# Altium footprint library SparkFun-Retired.PCBLIB: 302 footprints (part 19 of 19)
Each footprint in its own frame and in the unit in brackets; x right, y up, seen from the top. Pads: shape width x height; smd on the part's side, far side on the other; paste and mask are expansions set on the pad; w line width, h text height; cw(c..) or ccw(c..) is an arc to the next point about the centre after c.
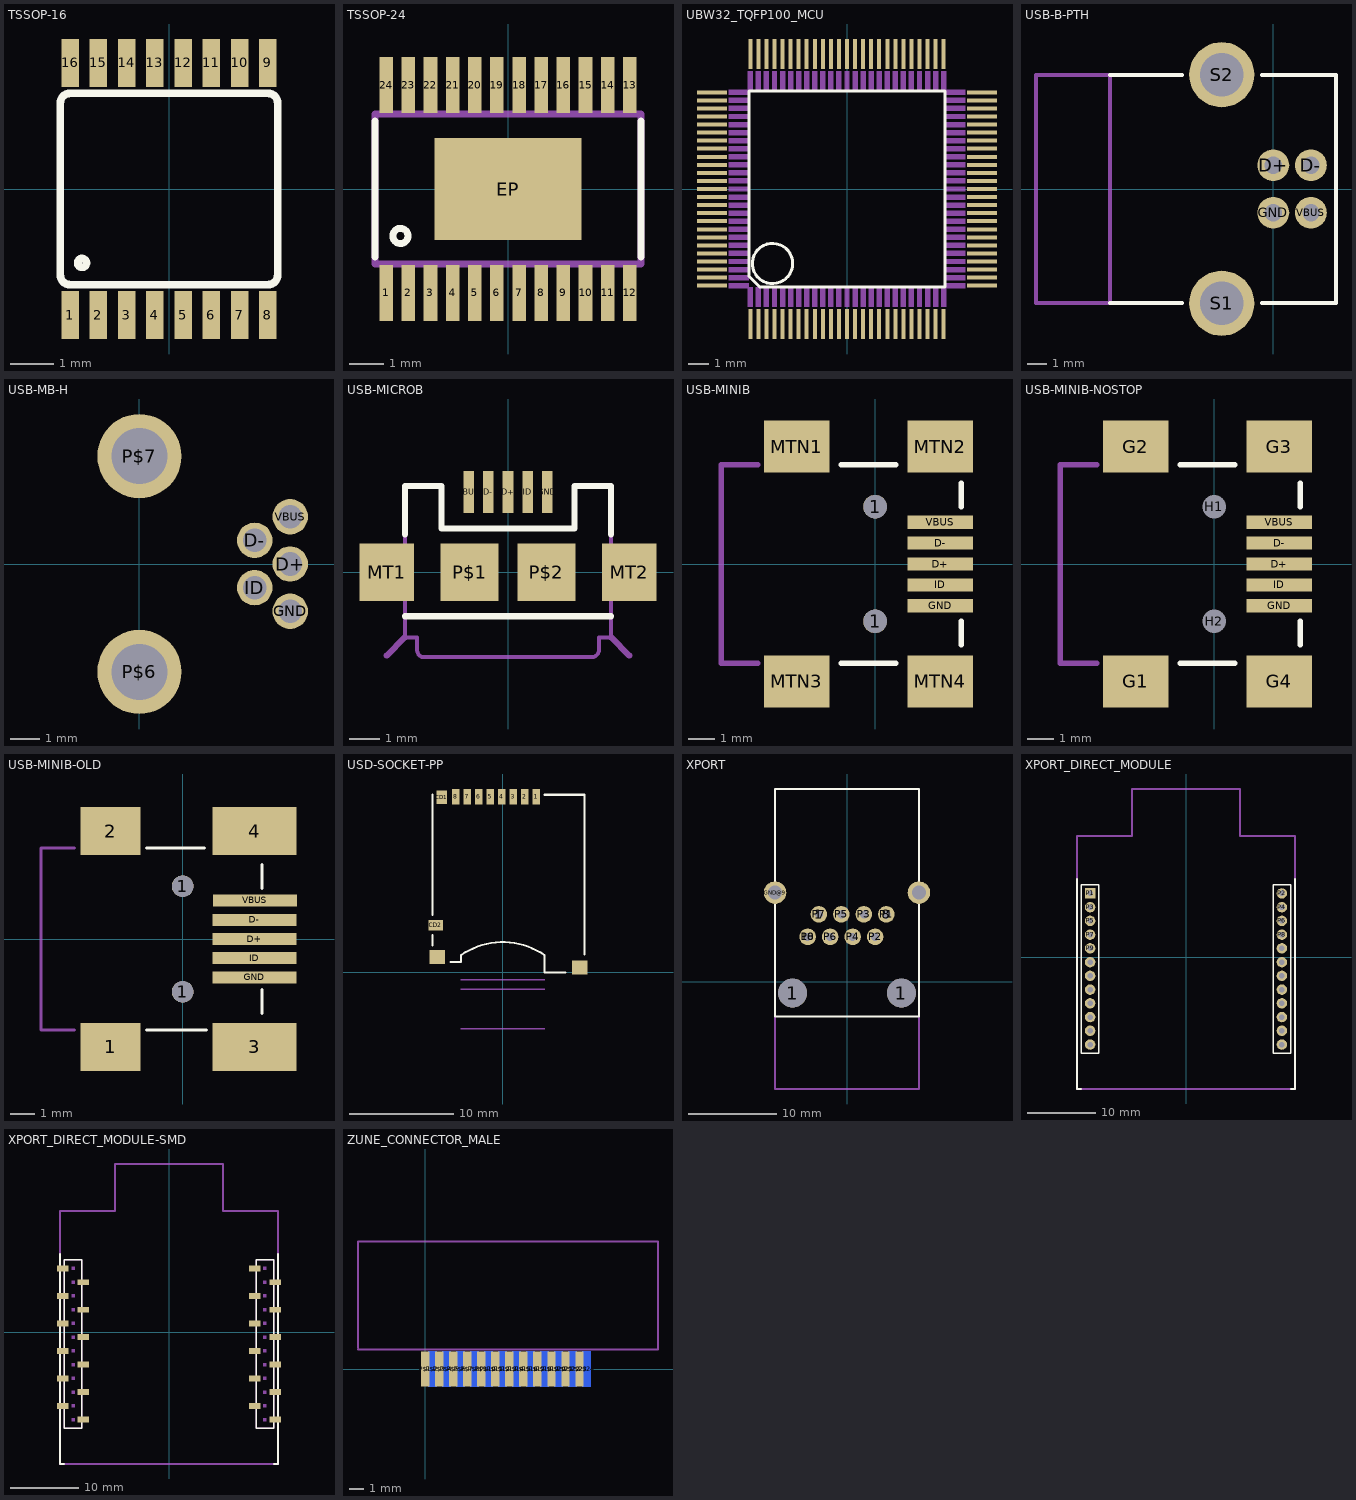
[diagram p18: the footprints below, top view; thin cyan lines are the x and y axes]

## TSSOP-16 [mil]
pads (16):
  rect 15.75x43.31 smd: 1(-89.57,-114.17) 2(-63.98,-114.17) 3(-38.39,-114.17) 4(-12.8,-114.17) 5(12.8,-114.17) 6(38.39,-114.17) 7(63.98,-114.17) 8(89.57,-114.17) 9(89.57,114.17) 10(63.98,114.17) 11(38.39,114.17) 12(12.8,114.17) 13(-12.8,114.17) 14(-38.39,114.17) 15(-63.98,114.17) 16(-89.57,114.17)
Top Overlay:
  circle w7: c-78.74,-66.93 r3.94
  lines w7: -98.43,-77.81 ccw(c-89.62,-77.81) -89.62,-86.61 89.62,-86.61 ccw(c89.62,-77.81) 98.43,-77.81 98.43,77.81 ccw(c89.62,77.81) 89.62,86.61 -89.62,86.61 ccw(c-89.62,77.81) -98.43,77.81 -98.43,-77.81
Mechanical 16:
  rectangle: 6.89,-125.98 18.7,-102.36
  rectangle: -18.7,-125.98 -6.89,-102.36
  rectangle: -44.29,-125.98 -32.48,-102.36
  rectangle: -69.88,-125.98 -58.07,-102.36
  rectangle: 32.48,-125.98 44.29,-102.36
  rectangle: 58.07,-125.98 69.88,-102.36
  rectangle: 83.66,-125.98 95.47,-102.36
  rectangle: -95.47,-125.98 -83.66,-102.36
  region: -6.89,125.98 -18.7,125.98 -18.7,102.36 -6.89,102.36
  region: 18.7,125.98 6.89,125.98 6.89,102.36 18.7,102.36
  region: 44.29,125.98 32.48,125.98 32.48,102.36 44.29,102.36
  region: 69.88,125.98 58.07,125.98 58.07,102.36 69.88,102.36
  region: -32.48,125.98 -44.29,125.98 -44.29,102.36 -32.48,102.36
  region: -58.07,125.98 -69.88,125.98 -69.88,102.36 -58.07,102.36
  region: -83.66,125.98 -95.47,125.98 -95.47,102.36 -83.66,102.36
  region: 95.47,125.98 83.66,125.98 83.66,102.36 95.47,102.36

## TSSOP-24 [mm]
pads (25):
  rect 0.4x1.65 smd: 1(-3.575,-3.05) 2(-2.925,-3.05) 3(-2.275,-3.05) 4(-1.625,-3.05) 5(-0.975,-3.05) 6(-0.325,-3.05) 7(0.325,-3.05) 8(0.975,-3.05) 9(1.625,-3.05) 10(2.275,-3.05) 11(2.925,-3.05) 12(3.575,-3.05) 13(3.575,3.05) 14(2.925,3.05) 15(2.275,3.05) 16(1.625,3.05) 17(0.975,3.05) 18(0.325,3.05) 19(-0.325,3.05) 20(-0.975,3.05) 21(-1.625,3.05) 22(-2.275,3.05) 23(-2.925,3.05) 24(-3.575,3.05)
  rect 4.32x3 smd: EP(0,0)
Top Overlay:
  circle w0.203: c-3.156,-1.378 r0.223
  lines w0.203: -3.9,-2 -3.9,2 ; 3.9,-2 3.9,2
Mechanical 16:
  rectangle: 0.2,-3.2 0.45,-2.2
  rectangle: 0.85,-3.2 1.1,-2.2
  rectangle: 1.5,-3.2 1.75,-2.2
  rectangle: 2.15,-3.2 2.4,-2.2
  rectangle: 2.8,-3.2 3.05,-2.2
  rectangle: 3.45,-3.2 3.7,-2.2
  rectangle: -0.45,-3.2 -0.2,-2.2
  rectangle: -1.1,-3.2 -0.85,-2.2
  rectangle: -1.75,-3.2 -1.5,-2.2
  rectangle: -2.4,-3.2 -2.15,-2.2
  rectangle: -3.05,-3.2 -2.8,-2.2
  rectangle: -3.7,-3.2 -3.45,-2.2
  rectangle: 0.2,2.2 0.45,3.2
  rectangle: 0.85,2.2 1.1,3.2
  rectangle: 1.5,2.2 1.75,3.2
  rectangle: 2.15,2.2 2.4,3.2
  rectangle: 2.8,2.2 3.05,3.2
  rectangle: 3.45,2.2 3.7,3.2
  rectangle: -0.45,2.2 -0.2,3.2
  rectangle: -1.1,2.2 -0.85,3.2
  rectangle: -1.75,2.2 -1.5,3.2
  rectangle: -2.4,2.2 -2.15,3.2
  rectangle: -3.05,2.2 -2.8,3.2
  rectangle: -3.7,2.2 -3.45,3.2
  lines w0.203: -3.9,-2.2 3.9,-2.2 3.9,2.2 -3.9,2.2 -3.9,-2.2

## UBW32_TQFP100_MCU [mm]
pads (100):
  rect 0.2x1.5 smd: 1(-4.8,-6.7) 2(-4.4,-6.7) 3(-4,-6.7) 4(-3.6,-6.7) 5(-3.2,-6.7) 6(-2.8,-6.7) 7(-2.4,-6.7) 8(-2,-6.7) 9(-1.6,-6.7) 10(-1.2,-6.7) 11(-0.8,-6.7) 12(-0.4,-6.7) 13(0,-6.7) 14(0.4,-6.7) 15(0.8,-6.7) 16(1.2,-6.7) 17(1.6,-6.7) 18(2,-6.7) 19(2.4,-6.7) 20(2.8,-6.7) 21(3.2,-6.7) 22(3.6,-6.7) 23(4,-6.7) 24(4.4,-6.7) 25(4.8,-6.7) 51(4.8,6.7) 52(4.4,6.7) 53(4,6.7) 54(3.6,6.7) 55(3.2,6.7) 56(2.8,6.7) 57(2.4,6.7) 58(2,6.7) 59(1.6,6.7) 60(1.2,6.7) 61(0.8,6.7) 62(0.4,6.7) 63(0,6.7) 64(-0.4,6.7) 65(-0.8,6.7) 66(-1.2,6.7) 67(-1.6,6.7) 68(-2,6.7) 69(-2.4,6.7) 70(-2.8,6.7) 71(-3.2,6.7) 72(-3.6,6.7) 73(-4,6.7) 74(-4.4,6.7) 75(-4.8,6.7)
  rect 1.5x0.2 smd: 26(6.7,-4.8) 27(6.7,-4.4) 28(6.7,-4) 29(6.7,-3.6) 30(6.7,-3.2) 31(6.7,-2.8) 32(6.7,-2.4) 33(6.7,-2) 34(6.7,-1.6) 35(6.7,-1.2) 36(6.7,-0.8) 37(6.7,-0.4) 38(6.7,0) 39(6.7,0.4) 40(6.7,0.8) 41(6.7,1.2) 42(6.7,1.6) 43(6.7,2) 44(6.7,2.4) 45(6.7,2.8) 46(6.7,3.2) 47(6.7,3.6) 48(6.7,4) 49(6.7,4.4) 50(6.7,4.8) 76(-6.7,4.8) 77(-6.7,4.4) 78(-6.7,4) 79(-6.7,3.6) 80(-6.7,3.2) 81(-6.7,2.8) 82(-6.7,2.4) 83(-6.7,2) 84(-6.7,1.6) 85(-6.7,1.2) 86(-6.7,0.8) 87(-6.7,0.4) 88(-6.7,0) 89(-6.7,-0.4) 90(-6.7,-0.8) 91(-6.7,-1.2) 92(-6.7,-1.6) 93(-6.7,-2) 94(-6.7,-2.4) 95(-6.7,-2.8) 96(-6.7,-3.2) 97(-6.7,-3.6) 98(-6.7,-4) 99(-6.7,-4.4) 100(-6.7,-4.8)
Top Overlay:
  circle w0.152: c-3.7,-3.7 r1
  lines w0.152: -4.873,-4.323 -4.323,-4.873 4.873,-4.873 4.873,4.873 -4.873,4.873 -4.873,-4.323
Top Paste:
  rectangle: -7.209,4.707 -6.386,4.892
  rectangle: -6.952,4.313 -6.154,4.491
  rectangle: -7.186,3.907 -6.363,4.092
  rectangle: -6.929,3.513 -6.132,3.691
  rectangle: -7.198,3.109 -6.375,3.294
  rectangle: -6.942,2.715 -6.144,2.893
  rectangle: -7.209,2.309 -6.386,2.494
  rectangle: -6.952,1.915 -6.154,2.093
  rectangle: -7.209,1.509 -6.386,1.694
  rectangle: -6.952,1.115 -6.154,1.293
  rectangle: -7.186,0.709 -6.363,0.894
  rectangle: -6.929,0.315 -6.132,0.493
  rectangle: -7.198,-0.089 -6.375,0.097
  rectangle: -6.942,-0.483 -6.144,-0.305
  rectangle: -7.209,-0.889 -6.386,-0.704
  rectangle: -6.952,-1.283 -6.154,-1.105
  rectangle: -7.209,-1.694 -6.386,-1.509
  rectangle: -6.952,-2.088 -6.154,-1.91
  rectangle: -7.186,-2.494 -6.363,-2.309
  rectangle: -6.929,-2.888 -6.132,-2.71
  rectangle: -7.198,-3.292 -6.375,-3.106
  rectangle: -6.942,-3.686 -6.144,-3.508
  rectangle: -7.209,-4.092 -6.386,-3.907
  rectangle: -6.952,-4.486 -6.154,-4.308
  rectangle: -7.209,-4.895 -6.386,-4.709
  region: -4.707,6.17 -4.707,6.993 -4.892,6.993 -4.892,6.17
  region: -4.313,6.426 -4.313,7.224 -4.491,7.224 -4.491,6.426
  region: -3.907,6.193 -3.907,7.015 -4.092,7.015 -4.092,6.193
  region: -3.513,6.449 -3.513,7.247 -3.691,7.247 -3.691,6.449
  region: -3.109,6.18 -3.109,7.003 -3.294,7.003 -3.294,6.18
  region: -2.715,6.436 -2.715,7.234 -2.893,7.234 -2.893,6.436
  region: -2.309,6.17 -2.309,6.993 -2.494,6.993 -2.494,6.17
  region: -1.915,6.426 -1.915,7.224 -2.093,7.224 -2.093,6.426
  region: -1.509,6.17 -1.509,6.993 -1.694,6.993 -1.694,6.17
  region: -1.115,6.426 -1.115,7.224 -1.293,7.224 -1.293,6.426
  region: -0.709,6.193 -0.709,7.015 -0.894,7.015 -0.894,6.193
  region: -0.315,6.449 -0.315,7.247 -0.493,7.247 -0.493,6.449
  region: 0.089,6.18 0.089,7.003 -0.097,7.003 -0.097,6.18
  region: 0.483,6.436 0.483,7.234 0.305,7.234 0.305,6.436
  region: 0.889,6.17 0.889,6.992 0.703,6.992 0.703,6.17
  region: 1.283,6.426 1.283,7.224 1.105,7.224 1.105,6.426
  region: 1.694,6.17 1.694,6.993 1.509,6.993 1.509,6.17
  region: 2.088,6.426 2.088,7.224 1.91,7.224 1.91,6.426
  region: 2.494,6.193 2.494,7.015 2.309,7.015 2.309,6.193
  region: 2.888,6.449 2.888,7.247 2.71,7.247 2.71,6.449
  region: 3.292,6.18 3.292,7.003 3.106,7.003 3.106,6.18
  region: 3.686,6.436 3.686,7.234 3.508,7.234 3.508,6.436
  region: 4.092,6.17 4.092,6.993 3.907,6.993 3.907,6.17
  region: 4.486,6.426 4.486,7.224 4.308,7.224 4.308,6.426
  region: 4.895,6.17 4.895,6.993 4.709,6.993 4.709,6.17
  region: 7.206,-4.707 6.383,-4.707 6.383,-4.892 7.206,-4.892
  region: 6.949,-4.313 6.152,-4.313 6.152,-4.491 6.949,-4.491
  region: 7.183,-3.907 6.36,-3.907 6.36,-4.092 7.183,-4.092
  region: 6.927,-3.513 6.129,-3.513 6.129,-3.691 6.927,-3.691
  region: 7.196,-3.109 6.373,-3.109 6.373,-3.294 7.196,-3.294
  region: 6.939,-2.715 6.142,-2.715 6.142,-2.893 6.939,-2.893
  region: 7.206,-2.309 6.383,-2.309 6.383,-2.494 7.206,-2.494
  region: 6.949,-1.915 6.152,-1.915 6.152,-2.093 6.949,-2.093
  region: 7.206,-1.509 6.383,-1.509 6.383,-1.694 7.206,-1.694
  region: 6.949,-1.115 6.152,-1.115 6.152,-1.293 6.949,-1.293
  region: 7.183,-0.709 6.36,-0.709 6.36,-0.894 7.183,-0.894
  region: 6.927,-0.315 6.129,-0.315 6.129,-0.493 6.927,-0.493
  region: 7.196,0.089 6.373,0.089 6.373,-0.097 7.196,-0.097
  region: 6.939,0.483 6.142,0.483 6.142,0.305 6.939,0.305
  region: 7.206,0.889 6.383,0.889 6.383,0.704 7.206,0.704
  region: 6.949,1.283 6.152,1.283 6.152,1.105 6.949,1.105
  region: 7.206,1.694 6.383,1.694 6.383,1.509 7.206,1.509
  region: 6.949,2.088 6.152,2.088 6.152,1.91 6.949,1.91
  region: 7.183,2.494 6.36,2.494 6.36,2.309 7.183,2.309
  region: 6.927,2.888 6.129,2.888 6.129,2.71 6.927,2.71
  region: 7.196,3.292 6.373,3.292 6.373,3.106 7.196,3.106
  region: 6.939,3.686 6.142,3.686 6.142,3.508 6.939,3.508
  region: 7.206,4.092 6.383,4.092 6.383,3.907 7.206,3.907
  region: 6.949,4.486 6.152,4.486 6.152,4.308 6.949,4.308
  region: 7.206,4.895 6.383,4.895 6.383,4.709 7.206,4.709
  region: -4.707,-7.219 -4.707,-6.396 -4.892,-6.396 -4.892,-7.219
  region: -4.313,-6.962 -4.313,-6.165 -4.491,-6.165 -4.491,-6.962
  region: -3.907,-7.196 -3.907,-6.373 -4.092,-6.373 -4.092,-7.196
  region: -3.513,-6.939 -3.513,-6.142 -3.691,-6.142 -3.691,-6.939
  region: -3.109,-7.209 -3.109,-6.386 -3.294,-6.386 -3.294,-7.209
  region: -2.715,-6.952 -2.715,-6.154 -2.893,-6.154 -2.893,-6.952
  region: -2.309,-7.219 -2.309,-6.396 -2.494,-6.396 -2.494,-7.219
  region: -1.915,-6.962 -1.915,-6.165 -2.093,-6.165 -2.093,-6.962
  region: -1.509,-7.219 -1.509,-6.396 -1.694,-6.396 -1.694,-7.219
  region: -1.115,-6.962 -1.115,-6.165 -1.293,-6.165 -1.293,-6.962
  region: -0.709,-7.196 -0.709,-6.373 -0.894,-6.373 -0.894,-7.196
  region: -0.315,-6.939 -0.315,-6.142 -0.493,-6.142 -0.493,-6.939
  region: 0.089,-7.208 0.089,-6.386 -0.097,-6.386 -0.097,-7.208
  region: 0.483,-6.952 0.483,-6.154 0.305,-6.154 0.305,-6.952
  region: 0.889,-7.219 0.889,-6.396 0.703,-6.396 0.703,-7.219
  region: 1.283,-6.962 1.283,-6.165 1.105,-6.165 1.105,-6.962
  region: 1.694,-7.219 1.694,-6.396 1.509,-6.396 1.509,-7.219
  region: 2.088,-6.962 2.088,-6.165 1.91,-6.165 1.91,-6.962
  region: 2.494,-7.196 2.494,-6.373 2.309,-6.373 2.309,-7.196
  region: 2.888,-6.939 2.888,-6.142 2.71,-6.142 2.71,-6.939
  region: 3.292,-7.209 3.292,-6.386 3.106,-6.386 3.106,-7.209
  region: 3.686,-6.952 3.686,-6.154 3.508,-6.154 3.508,-6.952
  region: 4.092,-7.219 4.092,-6.396 3.907,-6.396 3.907,-7.219
  region: 4.486,-6.962 4.486,-6.165 4.308,-6.165 4.308,-6.962
  region: 4.895,-7.219 4.895,-6.396 4.709,-6.396 4.709,-7.219
Mechanical 16:
  rectangle: -4.935,4.868 -4.665,5.873
  rectangle: -4.535,4.868 -4.265,5.873
  rectangle: -4.135,4.868 -3.865,5.873
  rectangle: -3.735,4.868 -3.465,5.873
  rectangle: -3.335,4.868 -3.065,5.873
  rectangle: -2.935,4.868 -2.665,5.873
  rectangle: -2.535,4.868 -2.265,5.873
  rectangle: -2.135,4.868 -1.865,5.873
  rectangle: -1.735,4.868 -1.465,5.873
  rectangle: -1.335,4.868 -1.065,5.873
  rectangle: -0.935,4.868 -0.665,5.873
  rectangle: -0.535,4.868 -0.265,5.873
  rectangle: -0.135,4.868 0.135,5.873
  rectangle: 0.265,4.868 0.535,5.873
  rectangle: 0.665,4.868 0.935,5.873
  rectangle: 1.065,4.868 1.335,5.873
  rectangle: 1.465,4.868 1.735,5.873
  rectangle: 1.865,4.868 2.135,5.873
  rectangle: 2.265,4.868 2.535,5.873
  rectangle: 2.665,4.868 2.935,5.873
  rectangle: 3.065,4.868 3.335,5.873
  rectangle: 3.465,4.868 3.735,5.873
  rectangle: 3.865,4.868 4.135,5.873
  rectangle: 4.265,4.868 4.535,5.873
  rectangle: 4.665,4.868 4.935,5.873
  rectangle: 4.873,4.665 5.878,4.935
  rectangle: 4.873,4.265 5.878,4.535
  rectangle: 4.873,3.865 5.878,4.135
  rectangle: 4.873,3.465 5.878,3.735
  rectangle: 4.873,3.065 5.878,3.335
  rectangle: 4.873,2.665 5.878,2.935
  rectangle: 4.873,2.265 5.878,2.535
  rectangle: 4.873,1.865 5.878,2.135
  rectangle: 4.873,1.465 5.878,1.735
  rectangle: 4.873,1.065 5.878,1.335
  rectangle: 4.873,0.665 5.878,0.935
  rectangle: 4.873,0.265 5.878,0.535
  rectangle: 4.873,-0.135 5.878,0.135
  rectangle: 4.873,-0.535 5.878,-0.265
  rectangle: 4.873,-0.935 5.878,-0.665
  rectangle: 4.873,-1.335 5.878,-1.065
  rectangle: 4.873,-1.735 5.878,-1.465
  rectangle: 4.873,-2.135 5.878,-1.865
  rectangle: 4.873,-2.535 5.878,-2.265
  rectangle: 4.873,-2.935 5.878,-2.665
  rectangle: 4.873,-3.335 5.878,-3.065
  rectangle: 4.873,-3.735 5.878,-3.465
  rectangle: 4.873,-4.135 5.878,-3.865
  rectangle: 4.873,-4.535 5.878,-4.265
  rectangle: 4.873,-4.935 5.878,-4.665
  rectangle: 4.665,-5.873 4.935,-4.868
  rectangle: 4.265,-5.873 4.535,-4.868
  rectangle: 3.865,-5.873 4.135,-4.868
  rectangle: 3.465,-5.873 3.735,-4.868
  rectangle: 3.065,-5.873 3.335,-4.868
  rectangle: 2.665,-5.873 2.935,-4.868
  rectangle: 2.265,-5.873 2.535,-4.868
  rectangle: 1.865,-5.873 2.135,-4.868
  rectangle: 1.465,-5.873 1.735,-4.868
  rectangle: 1.065,-5.873 1.335,-4.868
  rectangle: 0.665,-5.873 0.935,-4.868
  rectangle: 0.265,-5.873 0.535,-4.868
  rectangle: -0.135,-5.873 0.135,-4.868
  rectangle: -0.535,-5.873 -0.265,-4.868
  rectangle: -0.935,-5.873 -0.665,-4.868
  rectangle: -1.335,-5.873 -1.065,-4.868
  rectangle: -1.735,-5.873 -1.465,-4.868
  rectangle: -2.135,-5.873 -1.865,-4.868
  rectangle: -2.535,-5.873 -2.265,-4.868
  rectangle: -2.935,-5.873 -2.665,-4.868
  rectangle: -3.335,-5.873 -3.065,-4.868
  rectangle: -3.735,-5.873 -3.465,-4.868
  rectangle: -4.135,-5.873 -3.865,-4.868
  rectangle: -4.535,-5.873 -4.265,-4.868
  rectangle: -4.935,-5.873 -4.665,-4.868
  rectangle: -5.878,-4.935 -4.873,-4.665
  rectangle: -5.878,-4.535 -4.873,-4.265
  rectangle: -5.878,-4.135 -4.873,-3.865
  rectangle: -5.878,-3.735 -4.873,-3.465
  rectangle: -5.878,-3.335 -4.873,-3.065
  rectangle: -5.878,-2.935 -4.873,-2.665
  rectangle: -5.878,-2.535 -4.873,-2.265
  rectangle: -5.878,-2.135 -4.873,-1.865
  rectangle: -5.878,-1.735 -4.873,-1.465
  rectangle: -5.878,-1.335 -4.873,-1.065
  rectangle: -5.878,-0.935 -4.873,-0.665
  rectangle: -5.878,-0.535 -4.873,-0.265
  rectangle: -5.878,-0.135 -4.873,0.135
  rectangle: -5.878,0.265 -4.873,0.535
  rectangle: -5.878,0.665 -4.873,0.935
  rectangle: -5.878,1.065 -4.873,1.335
  rectangle: -5.878,1.465 -4.873,1.735
  rectangle: -5.878,1.865 -4.873,2.135
  rectangle: -5.878,2.265 -4.873,2.535
  rectangle: -5.878,2.665 -4.873,2.935
  rectangle: -5.878,3.065 -4.873,3.335
  rectangle: -5.878,3.465 -4.873,3.735
  rectangle: -5.878,3.865 -4.873,4.135
  rectangle: -5.878,4.265 -4.873,4.535
  rectangle: -5.878,4.665 -4.873,4.935

## USB-B-PTH [mil]
pads (6):
  round 66 hole 36: D+(0,49.21) D-(78,49.21) GND(0,-49.21) VBUS(78,-49.21)
  round 135 hole 90: S1(-107,-237) S2(-107,237)
Top Overlay:
  lines w8: -338.58,-236.22 -188.98,-236.22 ; -338.58,236.22 -188.98,236.22 ; -23.62,-236.22 129.92,-236.22 129.92,236.22 -23.62,236.22
Mechanical 16:
  lines w8: -492.13,-236.22 -338.58,-236.22 -338.58,236.22 -492.13,236.22 -492.13,-236.22

## USB-MB-H [mil]
pads (7):
  round 47.25 hole 31.5: D+(200.79,0) D-(153.54,31.5) GND(200.79,-62.99) ID(153.54,-31.5) VBUS(200.79,62.99)
  round 112.2 hole 74.8: P$6(0,-143.7) P$7(0,143.7)
Bottom Overlay:
  lines w5: -127.95,-49.21 68.9,-29.53 68.9,29.53 -127.95,49.21 ; 29.53,59.06 -127.95,78.74 -127.95,118.11 29.53,137.8 ; 49.21,-137.8 -127.95,-118.11 -127.95,-78.74 49.21,-59.06 ; -147.64,-153.54 -147.64,153.54 206.69,153.54 206.69,-153.54 -147.64,-153.54
Via Holes:
  rectangle: 127.95,118.11 226.38,173.23
  rectangle: 127.95,-173.23 226.38,-118.11
  rectangle: -147.64,-122.05 -56.1,122.05
  rectangle: -56.1,-91.54 -25.59,91.54

## USB-MICROB [mm]
pads (9):
  rect 0.35x1.4 smd: D+(0,2.65) D-(-0.65,2.65) GND(1.3,2.65) ID(0.65,2.65) VBUS(-1.3,2.65)
  rect 1.8x1.9 smd: MT1(-4,0) MT2(4,0)
  rect 1.9x1.9 smd: P$1(-1.27,0) P$2(1.27,0)
Top Overlay:
  lines w0.203: -3.4,-1.45 3.4,-1.45 ; -3.4,1.25 -3.4,2.85 -2.2,2.85 -2.2,1.45 2.2,1.45 2.2,2.85 3.4,2.85 3.4,1.25
Mechanical 16:
  lines w0.127: -3.4,-1.45 -3.4,-2.15 -3,-2.15 -3,-2.55 ccw(c-2.762,-2.565) -2.8,-2.8 2.75,-2.8 ccw(c2.765,-2.563) 3,-2.6 3,-2.15 3.4,-2.15 3.4,-1.45 ; -3.4,-1.45 -3.4,2.85 -2.2,2.85 -2.2,1.45 2.2,1.45 2.2,2.85 3.4,2.85 3.4,-1.45 ; -3.4,-1.45 3.4,-1.45
  lines w0.203: -4,-2.75 -3.4,-2.15 ; 3.4,-2.15 4,-2.75

## USB-MINIB [mm]
pads (11):
  round 0.9 hole 0.9: 1(0,-2.2) 1(0,2.2)
  rect 2.5x0.5 smd: D+(2.5,0) D-(2.5,0.8) GND(2.5,-1.6) ID(2.5,-0.8) VBUS(2.5,1.6)
  rect 2.5x2 smd: MTN1(-3,4.5) MTN2(2.5,4.5) MTN3(-3,-4.5) MTN4(2.5,-4.5)
Top Overlay:
  lines w0.203: -1.3,-3.8 0.8,-3.8 ; -1.3,3.8 0.8,3.8 ; 3.3,-3.1 3.3,-2.2 ; 3.3,2.2 3.3,3.1
Mechanical 16:
  lines w0.203: -4.5,-3.8 -5.9,-3.8 -5.9,3.8 -4.5,3.8

## USB-MINIB-NOSTOP [mil]
pads (11):
  rect 98.43x19.69 smd: D+(98.43,0) D-(98.43,31.5) GND(98.43,-62.99) ID(98.43,-31.5) VBUS(98.43,62.99)
  rect 98.43x78.74 smd: G1(-118.11,-177.17) G2(-118.11,177.17) G3(98.43,177.17) G4(98.43,-177.17)
  round 31.5 hole 35.43: H1(0,86.61)
  round 31 hole 35.43: H2(0,-86.61)
Top Overlay:
  lines w8: -51.18,-149.61 31.5,-149.61 ; -51.18,149.61 31.5,149.61 ; 129.92,-122.05 129.92,-86.61 ; 129.92,86.61 129.92,122.05
Top Solder:
  circle w16.14: c0,86.61 r13.78
  circle w16.14: c0,-86.61 r13.78
Mechanical 16:
  lines w8: -177.17,-149.61 -232.28,-149.61 -232.28,149.61 -177.17,149.61

## USB-MINIB-OLD [mm]
pads (11):
  rect 2.5x2 smd: 1(-3,-4.5) 2(-3,4.5)
  round 0.9 hole 0.9: 1(0,-2.2) 1(0,2.2)
  rect 3.5x2 smd: 3(3,-4.5) 4(3,4.5)
  rect 3.5x0.5 smd: D+(3,0) D-(3,0.8) GND(3,-1.6) ID(3,-0.8) VBUS(3.01,1.61)
Top Overlay:
  lines w0.127: -1.5,-3.8 1,-3.8 ; -1.5,3.8 0.9,3.8 ; 3.3,-3.1 3.3,-2.1 ; 3.3,2.1 3.3,3.1
Mechanical 16:
  lines w0.127: -4.5,-3.8 -5.9,-3.8 -5.9,3.8 -4.5,3.8

## USD-SOCKET-PP [mm]
pads (12):
  rect 0.75x1.5 smd: 1(3.2,16.8) 2(2.1,16.8) 3(1,16.8) 4(-0.1,16.8) 5(-1.2,16.8) 6(-2.3,16.8) 7(-3.4,16.8) 8(-4.5,16.8)
  rect 1x1.3 smd: CD1(-5.85,16.75)
  rect 1.4x1 smd: CD2(-6.425,4.5)
  rect 1.5x1.35 smd: GND1(-6.275,1.475) GND2(7.375,0.475)
Top Overlay:
  lines w0.203: -6.725,2.6 -6.725,3.6 ; -6.725,5.5 -6.725,17 ; -5,1 -4,1 -4,1.65 cw(c0,-4.125) 4,1.65 4,0 6,0 ; 4,17 7.825,17 7.825,1.7
Mechanical 16:
  lines w0.127: -4,-5.4 4,-5.4 ; -4,-1.6 4,-1.6 ; -4,-0.7 4,-0.7

## XPORT [mil]
pads (15):
  round 128 hole 128: 1(-242,-50) 1(242,-50)
  round 74 hole 35: 1(-125,300) 8(175,300) 10(-175,200) P1(175,300) P2(125,200) P3(75,300) P4(25,200) P5(-25,300) P6(-75,200) P7(-125,300) P8(-175,200)
  round 100 hole 62.99: GND@9(-320,396.89) GND@10(320,396.89)
Top Overlay:
  lines w8: -320,-155 -320,858 320,858 320,-155 -320,-155
Mechanical 16:
  lines w8: -320,-155 -320,-477 320,-477 320,-155

## XPORT_DIRECT_MODULE [mil]
pads (24):
  rect 60x60 hole 31.5: P1(-550,366.14)
  round 60 hole 31.5: P2(550,366.14) P3(-550,287.4) P4(550,287.4) P5(-550,208.66) P6(550,208.66) P7(-550,129.92) P8(550,129.92) P9(-550,51.18) P10(550,51.18) P11(-550,-27.56) P12(550,-27.56) P13(-550,-106.3) P14(550,-106.3) P15(-550,-185.04) P16(550,-185.04) P17(-550,-263.78) P18(550,-263.78) P19(-550,-342.52) P20(550,-342.52) P21(-550,-421.26) P22(550,-421.26) P23(-550,-500) P24(550,-500)
Top Overlay:
  lines w8: -599.21,-549.21 -599.21,415.35 -500.79,415.35 -500.79,-549.21 -599.21,-549.21 ; 500.79,-549.21 500.79,415.35 599.21,415.35 599.21,-549.21 500.79,-549.21
  lines w10: -625,450 -625,-755 -600,-755 ; 600,-755 625,-755 625,450
Mechanical 16:
  region: -540,-352.52 -540,-332.52 -560,-332.52 -560,-352.52
  region: -540,-431.26 -540,-411.26 -560,-411.26 -560,-431.26
  region: -540,-510 -540,-490 -560,-490 -560,-510
  region: -540,-273.78 -540,-253.78 -560,-253.78 -560,-273.78
  region: -540,-195.04 -540,-175.04 -560,-175.04 -560,-195.04
  region: -540,-116.3 -540,-96.3 -560,-96.3 -560,-116.3
  region: -540,-37.56 -540,-17.56 -560,-17.56 -560,-37.56
  region: -540,41.18 -540,61.18 -560,61.18 -560,41.18
  region: -540,119.92 -540,139.92 -560,139.92 -560,119.92
  region: -540,198.66 -540,218.66 -560,218.66 -560,198.66
  region: -540,277.4 -540,297.4 -560,297.4 -560,277.4
  region: -540,356.14 -540,376.14 -560,376.14 -560,356.14
  region: 560,-352.52 560,-332.52 540,-332.52 540,-352.52
  region: 560,-431.26 560,-411.26 540,-411.26 540,-431.26
  region: 560,-510 560,-490 540,-490 540,-510
  region: 560,-273.78 560,-253.78 540,-253.78 540,-273.78
  region: 560,-195.04 560,-175.04 540,-175.04 540,-195.04
  region: 560,-116.3 560,-96.3 540,-96.3 540,-116.3
  region: 560,-37.56 560,-17.56 540,-17.56 540,-37.56
  region: 560,41.18 560,61.18 540,61.18 540,41.18
  region: 560,119.92 560,139.92 540,139.92 540,119.92
  region: 560,198.66 560,218.66 540,218.66 540,198.66
  region: 560,277.4 560,297.4 540,297.4 540,277.4
  region: 560,356.14 560,376.14 540,376.14 540,356.14
  lines w10: -625,-755 625,-755 625,695 310,695 310,965 -310,965 -310,695 -625,695 -625,-755

## XPORT_DIRECT_MODULE-SMD [mil]
pads (24):
  rect 66.93x33.46 smd: P1(-609.13,365.9) P2(490.87,365.9) P3(-491.02,287.16) P4(608.98,287.16) P5(-609.13,208.4) P6(490.87,208.4) P7(-491.02,129.68) P8(608.98,129.68) P9(-609.13,50.92) P10(490.87,50.92) P11(-491.02,-27.82) P12(608.98,-27.82) P13(-609.13,-106.56) P14(490.87,-106.56) P15(-491.02,-185.3) P16(608.98,-185.3) P17(-609.13,-264.04) P18(490.87,-264.04) P19(-491.02,-342.78) P20(608.98,-342.78) P21(-609.13,-421.52) P22(490.87,-421.52) P23(-491.02,-500.26) P24(608.98,-500.26)
Top Overlay:
  lines w8: -599.28,-527.82 -599.28,-549.47 -500.86,-549.47 -500.86,-527.82 ; -599.28,389.52 -599.28,415.11 -500.86,415.11 -500.86,389.52 ; 500.72,-527.82 500.72,-549.47 599.14,-549.47 599.14,-527.82 ; 500.72,389.52 500.72,415.11 599.14,415.11 599.14,389.52 ; -599.21,-549.21 -599.21,415.35 -500.79,415.35 -500.79,-549.21 -599.21,-549.21 ; 500.79,-549.21 500.79,415.35 599.21,415.35 599.21,-549.21 500.79,-549.21
  lines w10: -625,450 -625,-755 -600,-755 ; 600,-755 625,-755 625,450
Mechanical 16:
  region: -540,-352.52 -540,-332.52 -560,-332.52 -560,-352.52
  region: -540,-431.26 -540,-411.26 -560,-411.26 -560,-431.26
  region: -540,-510 -540,-490 -560,-490 -560,-510
  region: -540,-273.78 -540,-253.78 -560,-253.78 -560,-273.78
  region: -540,-195.04 -540,-175.04 -560,-175.04 -560,-195.04
  region: -540,-116.3 -540,-96.3 -560,-96.3 -560,-116.3
  region: -540,-37.56 -540,-17.56 -560,-17.56 -560,-37.56
  region: -540,41.18 -540,61.18 -560,61.18 -560,41.18
  region: -540,119.92 -540,139.92 -560,139.92 -560,119.92
  region: -540,198.66 -540,218.66 -560,218.66 -560,198.66
  region: -540,277.4 -540,297.4 -560,297.4 -560,277.4
  region: -540,356.14 -540,376.14 -560,376.14 -560,356.14
  region: 560,-352.52 560,-332.52 540,-332.52 540,-352.52
  region: 560,-431.26 560,-411.26 540,-411.26 540,-431.26
  region: 560,-510 560,-490 540,-490 540,-510
  region: 560,-273.78 560,-253.78 540,-253.78 540,-273.78
  region: 560,-195.04 560,-175.04 540,-175.04 540,-195.04
  region: 560,-116.3 560,-96.3 540,-96.3 540,-116.3
  region: 560,-37.56 560,-17.56 540,-17.56 540,-37.56
  region: 560,41.18 560,61.18 540,61.18 540,41.18
  region: 560,119.92 560,139.92 540,139.92 540,119.92
  region: 560,198.66 560,218.66 540,218.66 540,198.66
  region: 560,277.4 560,297.4 540,297.4 540,277.4
  region: 560,356.14 560,376.14 540,376.14 540,356.14
  lines w8: -599.28,-391.97 -599.28,415.11 -500.86,415.11 -500.86,-391.97 ; -599.28,257.61 -599.28,-549.47 -500.86,-549.47 -500.86,257.61 ; 500.72,-391.97 500.72,415.11 599.14,415.11 599.14,-391.97 ; 500.72,257.61 500.72,-549.47 599.14,-549.47 599.14,257.61
  lines w10: -625,-755 625,-755 625,695 310,695 310,965 -310,965 -310,695 -625,695 -625,-755

## ZUNE_CONNECTOR_MALE [mm]
pads (24):
  rect 0.6x2.5 smd: P$1(0,0) P$3(1,0) P$5(2,0) P$7(3,0) P$9(4,0) P$11(5,0) P$13(6,0) P$15(7,0) P$17(8,0) P$19(9,0) P$21(10,0) P$23(11,0)
  rect 0.6x2.5 smd far side: P$2(0.5,0) P$4(1.5,0) P$6(2.5,0) P$8(3.5,0) P$10(4.5,0) P$12(5.5,0) P$14(6.5,0) P$16(7.5,0) P$18(8.5,0) P$20(9.5,0) P$22(10.5,0) P$24(11.5,0)
Mechanical 16:
  lines w0.127: -4.8,1.4 16.6,1.4 16.6,9.1 -4.8,9.1 -4.8,1.5
  text "Connector should be used only with 1.2mm PCB thickness." at -0.9,1.8 h0.47